# Altium footprint library SAMTEC THD.PcbLib: 161 footprints (part 11 of 12)
Each footprint in its own frame and in the unit in brackets; x right, y up, seen from the top. Pads: shape width x height; smd on the part's side, far side on the other; paste and mask are expansions set on the pad; w line width, h text height; cw(c..) or ccw(c..) is an arc to the next point about the centre after c.
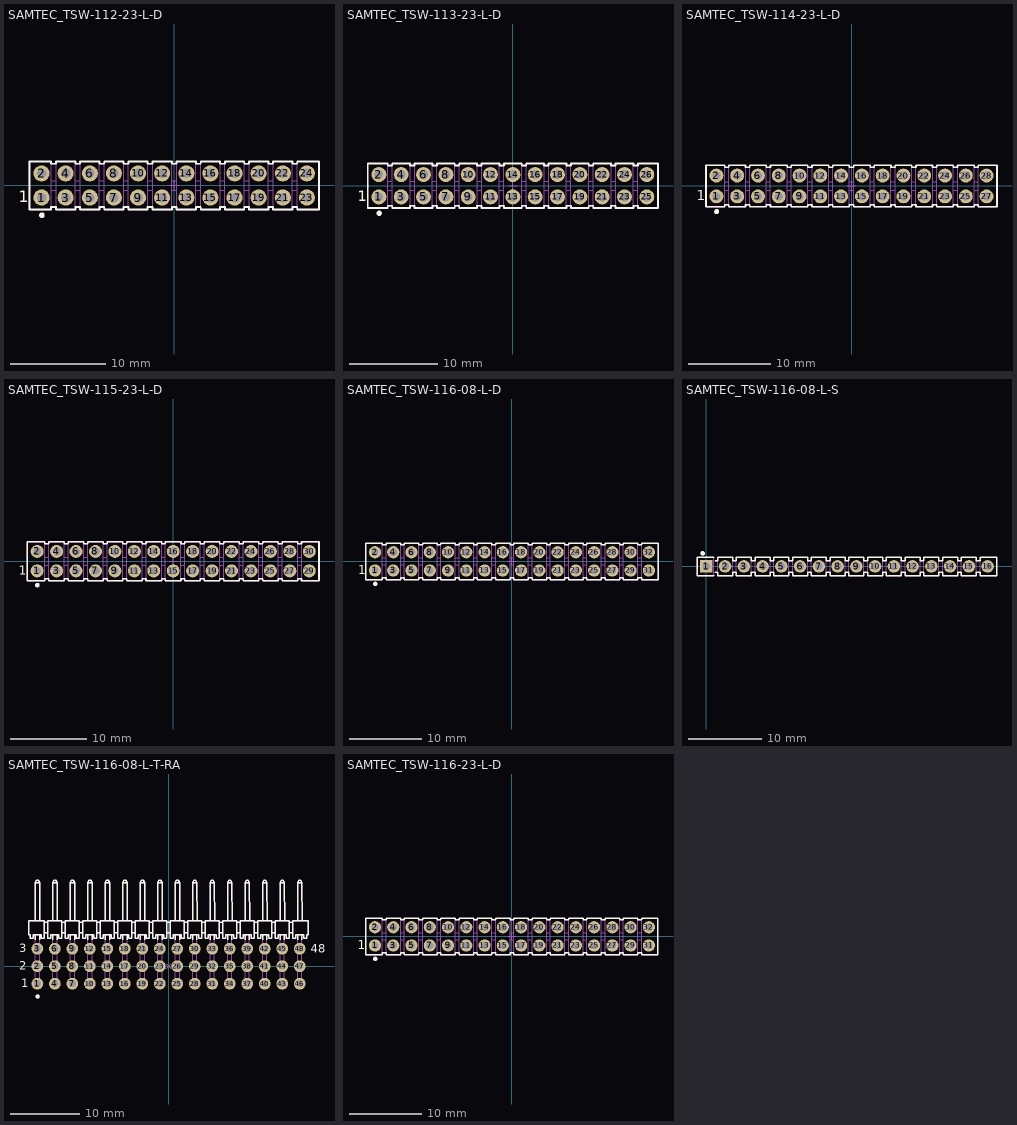
[diagram p10: the footprints below, top view; thin cyan lines are the x and y axes]

## SAMTEC_TSW-112-23-L-D [mm] "24 Contacts - Pitch 2.54mm - Dual Row  Through Mount Straigh Header (Post Lead 5.84mm, Tail Lead 2.92mm, Insulator 2.54mm)"
height 8.38
pads (24):
  round 1.7 hole 1: 1(-13.97,-1.27) 2(-13.97,1.27) 3(-11.43,-1.27) 4(-11.43,1.27) 5(-8.89,-1.27) 6(-8.89,1.27) 7(-6.35,-1.27) 8(-6.35,1.27) 9(-3.81,-1.27) 10(-3.81,1.27) 11(-1.27,-1.27) 12(-1.27,1.27) 13(1.27,-1.27) 14(1.27,1.27) 15(3.81,-1.27) 16(3.81,1.27) 17(6.35,-1.27) 18(6.35,1.27) 19(8.89,-1.27) 20(8.89,1.27) 21(11.43,-1.27) 22(11.43,1.27) 23(13.97,-1.27) 24(13.97,1.27)
Top Overlay:
  circle w0.3: c-13.935,-3.135 r0.15
  lines w0.2: -15.24,-2.54 -15.24,2.54 -12.954,2.54 -12.954,2.286 -12.446,2.286 -12.446,2.54 -10.414,2.54 -10.414,2.286 -9.906,2.286 -9.906,2.54 -7.874,2.54 -7.874,2.286 -7.366,2.286 -7.366,2.54 -5.334,2.54 -5.334,2.286 -4.826,2.286 -4.826,2.54 -2.794,2.54 -2.794,2.286 -2.286,2.286 -2.286,2.54 -0.254,2.54 -0.254,2.286 0.254,2.286 0.254,2.54 2.286,2.54 2.286,2.286 2.794,2.286 2.794,2.54 4.826,2.54 4.826,2.286 5.334,2.286 5.334,2.54 7.366,2.54 7.366,2.286 7.874,2.286 7.874,2.54 9.906,2.54 9.906,2.286 10.414,2.286 10.414,2.54 12.446,2.54 12.446,2.286 12.954,2.286 12.954,2.54 15.24,2.54 15.24,-2.54 12.954,-2.54 12.954,-2.286 12.446,-2.286 12.446,-2.54 10.414,-2.54 10.414,-2.286 9.906,-2.286 9.906,-2.54 7.874,-2.54 7.874,-2.286 7.366,-2.286 7.366,-2.54 5.334,-2.54 5.334,-2.286 4.826,-2.286 4.826,-2.54 2.794,-2.54 2.794,-2.286 2.286,-2.286 2.286,-2.54 0.254,-2.54 0.254,-2.286 -0.254,-2.286 -0.254,-2.54 -2.286,-2.54 -2.286,-2.286 -2.794,-2.286 -2.794,-2.54 -4.826,-2.54 -4.826,-2.286 -5.334,-2.286 -5.334,-2.54 -7.366,-2.54 -7.366,-2.286 -7.874,-2.286 -7.874,-2.54 -9.906,-2.54 -9.906,-2.286 -10.414,-2.286 -10.414,-2.54 -12.446,-2.54 -12.446,-2.286 -12.954,-2.286 -12.954,-2.54 -15.24,-2.54
  text "1" at -16.342,-1.768 h1.2
Mechanical 8:
  lines w0.05: -14.47,-1.27 -13.97,-1.27 ; -14.47,1.27 -13.97,1.27 ; -13.97,-1.77 -13.97,-1.27 ; -13.97,-0.77 -13.97,-1.27 ; -13.97,0.77 -13.97,1.27 ; -13.97,1.77 -13.97,1.27 ; -13.47,-1.27 -13.97,-1.27 ; -13.47,1.27 -13.97,1.27 ; -11.93,-1.27 -11.43,-1.27 ; -11.93,1.27 -11.43,1.27 ; -11.43,-1.77 -11.43,-1.27 ; -11.43,-0.77 -11.43,-1.27 ; -11.43,0.77 -11.43,1.27 ; -11.43,1.77 -11.43,1.27 ; -10.93,-1.27 -11.43,-1.27 ; -10.93,1.27 -11.43,1.27 ; -9.39,-1.27 -8.89,-1.27 ; -9.39,1.27 -8.89,1.27 ; -8.89,-1.77 -8.89,-1.27 ; -8.89,-0.77 -8.89,-1.27 ; -8.89,0.77 -8.89,1.27 ; -8.89,1.77 -8.89,1.27 ; -8.39,-1.27 -8.89,-1.27 ; -8.39,1.27 -8.89,1.27 ; -6.85,-1.27 -6.35,-1.27 ; -6.85,1.27 -6.35,1.27 ; -6.35,-1.77 -6.35,-1.27 ; -6.35,-0.77 -6.35,-1.27 ; -6.35,0.77 -6.35,1.27 ; -6.35,1.77 -6.35,1.27 ; -5.85,-1.27 -6.35,-1.27 ; -5.85,1.27 -6.35,1.27 ; -4.31,-1.27 -3.81,-1.27 ; -4.31,1.27 -3.81,1.27 ; -3.81,-1.77 -3.81,-1.27 ; -3.81,-0.77 -3.81,-1.27 ; -3.81,0.77 -3.81,1.27 ; -3.81,1.77 -3.81,1.27 ; -3.31,-1.27 -3.81,-1.27 ; -3.31,1.27 -3.81,1.27 ; -1.77,-1.27 -1.27,-1.27 ; -1.77,1.27 -1.27,1.27 ; -1.27,-1.77 -1.27,-1.27 ; -1.27,-0.77 -1.27,-1.27 ; -1.27,0.77 -1.27,1.27 ; -1.27,1.77 -1.27,1.27 ; -0.77,-1.27 -1.27,-1.27 ; -0.77,1.27 -1.27,1.27 ; -0.5,0 0,0 ; 0,-0.5 0,0 ; 0,0.5 0,0 ; 0.5,0 0,0 ; 0.77,-1.27 1.27,-1.27 ; 0.77,1.27 1.27,1.27 ; 1.27,-1.77 1.27,-1.27 ; 1.27,-0.77 1.27,-1.27 ; 1.27,0.77 1.27,1.27 ; 1.27,1.77 1.27,1.27 ; 1.77,-1.27 1.27,-1.27 ; 1.77,1.27 1.27,1.27 ; 3.31,-1.27 3.81,-1.27 ; 3.31,1.27 3.81,1.27 ; 3.81,-1.77 3.81,-1.27 ; 3.81,-0.77 3.81,-1.27 ; 3.81,0.77 3.81,1.27 ; 3.81,1.77 3.81,1.27 ; 4.31,-1.27 3.81,-1.27 ; 4.31,1.27 3.81,1.27 ; 5.85,-1.27 6.35,-1.27 ; 5.85,1.27 6.35,1.27 ; 6.35,-1.77 6.35,-1.27 ; 6.35,-0.77 6.35,-1.27 ; 6.35,0.77 6.35,1.27 ; 6.35,1.77 6.35,1.27 ; 6.85,-1.27 6.35,-1.27 ; 6.85,1.27 6.35,1.27 ; 8.39,-1.27 8.89,-1.27 ; 8.39,1.27 8.89,1.27 ; 8.89,-1.77 8.89,-1.27 ; 8.89,-0.77 8.89,-1.27 ; 8.89,0.77 8.89,1.27 ; 8.89,1.77 8.89,1.27 ; 9.39,-1.27 8.89,-1.27 ; 9.39,1.27 8.89,1.27 ; 10.93,-1.27 11.43,-1.27 ; 10.93,1.27 11.43,1.27 ; 11.43,-1.77 11.43,-1.27 ; 11.43,-0.77 11.43,-1.27 ; 11.43,0.77 11.43,1.27 ; 11.43,1.77 11.43,1.27 ; 11.93,-1.27 11.43,-1.27 ; 11.93,1.27 11.43,1.27 ; 13.47,-1.27 13.97,-1.27 ; 13.47,1.27 13.97,1.27 ; 13.97,-1.77 13.97,-1.27 ; 13.97,-0.77 13.97,-1.27 ; 13.97,0.77 13.97,1.27 ; 13.97,1.77 13.97,1.27 ; 14.47,-1.27 13.97,-1.27 ; 14.47,1.27 13.97,1.27
Mechanical 14:
  lines w0.1: -12.954,-2.286 -12.446,-2.286 ; -12.954,-0.508 -12.446,-0.508 ; -12.954,0.508 -12.446,0.508 ; -12.954,2.286 -12.446,2.286 ; -10.414,-2.286 -9.906,-2.286 ; -10.414,-0.508 -9.906,-0.508 ; -10.414,0.508 -9.906,0.508 ; -10.414,2.286 -9.906,2.286 ; -7.874,-2.286 -7.366,-2.286 ; -7.874,-0.508 -7.366,-0.508 ; -7.874,0.508 -7.366,0.508 ; -7.874,2.286 -7.366,2.286 ; -5.334,-2.286 -4.826,-2.286 ; -5.334,-0.508 -4.826,-0.508 ; -5.334,0.508 -4.826,0.508 ; -5.334,2.286 -4.826,2.286 ; -2.794,-2.286 -2.286,-2.286 ; -2.794,-0.508 -2.286,-0.508 ; -2.794,0.508 -2.286,0.508 ; -2.794,2.286 -2.286,2.286 ; -0.254,-2.286 0.254,-2.286 ; -0.254,-0.508 0.254,-0.508 ; -0.254,0.508 0.254,0.508 ; -0.254,2.286 0.254,2.286 ; 2.286,-2.286 2.794,-2.286 ; 2.286,-0.508 2.794,-0.508 ; 2.286,0.508 2.794,0.508 ; 2.286,2.286 2.794,2.286 ; 4.826,-2.286 5.334,-2.286 ; 4.826,-0.508 5.334,-0.508 ; 4.826,0.508 5.334,0.508 ; 4.826,2.286 5.334,2.286 ; 7.366,-2.286 7.874,-2.286 ; 7.366,-0.508 7.874,-0.508 ; 7.366,0.508 7.874,0.508 ; 7.366,2.286 7.874,2.286 ; 9.906,-2.286 10.414,-2.286 ; 9.906,-0.508 10.414,-0.508 ; 9.906,0.508 10.414,0.508 ; 9.906,2.286 10.414,2.286 ; 12.446,-2.286 12.954,-2.286 ; 12.446,-0.508 12.954,-0.508 ; 12.446,0.508 12.954,0.508 ; 12.446,2.286 12.954,2.286 ; -15.24,-2.54 -12.954,-2.54 -12.954,2.54 -15.24,2.54 -15.24,-2.54 ; -12.446,-2.54 -10.414,-2.54 -10.414,2.54 -12.446,2.54 -12.446,-2.54 ; -9.906,-2.54 -7.874,-2.54 -7.874,2.54 -9.906,2.54 -9.906,-2.54 ; -7.366,-2.54 -5.334,-2.54 -5.334,2.54 -7.366,2.54 -7.366,-2.54 ; -4.826,-2.54 -2.794,-2.54 -2.794,2.54 -4.826,2.54 -4.826,-2.54 ; -2.286,-2.54 -0.254,-2.54 -0.254,2.54 -2.286,2.54 -2.286,-2.54 ; 0.254,-2.54 2.286,-2.54 2.286,2.54 0.254,2.54 0.254,-2.54 ; 2.794,-2.54 4.826,-2.54 4.826,2.54 2.794,2.54 2.794,-2.54 ; 5.334,-2.54 7.366,-2.54 7.366,2.54 5.334,2.54 5.334,-2.54 ; 7.874,-2.54 9.906,-2.54 9.906,2.54 7.874,2.54 7.874,-2.54 ; 10.414,-2.54 12.446,-2.54 12.446,2.54 10.414,2.54 10.414,-2.54 ; 12.954,-2.54 15.24,-2.54 15.24,2.54 12.954,2.54 12.954,-2.54
3D body "SAMTEC_TSW-112-23-L-D.stp": height 8.38, standoff -2.92, extent -15.24,-2.54 15.24,2.54

## SAMTEC_TSW-113-23-L-D [mm] "26 Contacts - Pitch 2.54mm - Dual Row  Through Mount Straigh Header (Post Lead 5.84mm, Tail Lead 2.92mm, Insulator 2.54mm)"
height 8.38
pads (26):
  round 1.7 hole 1: 1(-15.24,-1.27) 2(-15.24,1.27) 3(-12.7,-1.27) 4(-12.7,1.27) 5(-10.16,-1.27) 6(-10.16,1.27) 7(-7.62,-1.27) 8(-7.62,1.27) 9(-5.08,-1.27) 10(-5.08,1.27) 11(-2.54,-1.27) 12(-2.54,1.27) 13(0,-1.27) 14(0,1.27) 15(2.54,-1.27) 16(2.54,1.27) 17(5.08,-1.27) 18(5.08,1.27) 19(7.62,-1.27) 20(7.62,1.27) 21(10.16,-1.27) 22(10.16,1.27) 23(12.7,-1.27) 24(12.7,1.27) 25(15.24,-1.27) 26(15.24,1.27)
Top Overlay:
  circle w0.3: c-15.205,-3.135 r0.15
  lines w0.2: -16.51,-2.54 -14.224,-2.54 -14.224,-2.286 -13.716,-2.286 -13.716,-2.54 -11.684,-2.54 -11.684,-2.286 -11.176,-2.286 -11.176,-2.54 -9.144,-2.54 -9.144,-2.286 -8.636,-2.286 -8.636,-2.54 -6.604,-2.54 -6.604,-2.286 -6.096,-2.286 -6.096,-2.54 -4.064,-2.54 -4.064,-2.286 -3.556,-2.286 -3.556,-2.54 -1.524,-2.54 -1.524,-2.286 -1.016,-2.286 -1.016,-2.54 1.016,-2.54 1.016,-2.286 1.524,-2.286 1.524,-2.54 3.556,-2.54 3.556,-2.286 4.064,-2.286 4.064,-2.54 6.096,-2.54 6.096,-2.286 6.604,-2.286 6.604,-2.54 8.636,-2.54 8.636,-2.286 9.144,-2.286 9.144,-2.54 11.176,-2.54 11.176,-2.286 11.684,-2.286 11.684,-2.54 13.716,-2.54 13.716,-2.286 14.224,-2.286 14.224,-2.54 16.51,-2.54 16.51,2.54 14.224,2.54 14.224,2.286 13.716,2.286 13.716,2.54 11.684,2.54 11.684,2.286 11.176,2.286 11.176,2.54 9.144,2.54 9.144,2.286 8.636,2.286 8.636,2.54 6.604,2.54 6.604,2.286 6.096,2.286 6.096,2.54 4.064,2.54 4.064,2.286 3.556,2.286 3.556,2.54 1.524,2.54 1.524,2.286 1.016,2.286 1.016,2.54 -1.016,2.54 -1.016,2.286 -1.524,2.286 -1.524,2.54 -3.556,2.54 -3.556,2.286 -4.064,2.286 -4.064,2.54 -6.096,2.54 -6.096,2.286 -6.604,2.286 -6.604,2.54 -8.636,2.54 -8.636,2.286 -9.144,2.286 -9.144,2.54 -11.176,2.54 -11.176,2.286 -11.684,2.286 -11.684,2.54 -13.716,2.54 -13.716,2.286 -14.224,2.286 -14.224,2.54 -16.51,2.54 -16.51,-2.54
  text "1" at -17.612,-1.768 h1.2
Mechanical 8:
  lines w0.05: -15.74,-1.27 -15.24,-1.27 ; -15.74,1.27 -15.24,1.27 ; -15.24,-1.77 -15.24,-1.27 ; -15.24,-0.77 -15.24,-1.27 ; -15.24,0.77 -15.24,1.27 ; -15.24,1.77 -15.24,1.27 ; -14.74,-1.27 -15.24,-1.27 ; -14.74,1.27 -15.24,1.27 ; -13.2,-1.27 -12.7,-1.27 ; -13.2,1.27 -12.7,1.27 ; -12.7,-1.77 -12.7,-1.27 ; -12.7,-0.77 -12.7,-1.27 ; -12.7,0.77 -12.7,1.27 ; -12.7,1.77 -12.7,1.27 ; -12.2,-1.27 -12.7,-1.27 ; -12.2,1.27 -12.7,1.27 ; -10.66,-1.27 -10.16,-1.27 ; -10.66,1.27 -10.16,1.27 ; -10.16,-1.77 -10.16,-1.27 ; -10.16,-0.77 -10.16,-1.27 ; -10.16,0.77 -10.16,1.27 ; -10.16,1.77 -10.16,1.27 ; -9.66,-1.27 -10.16,-1.27 ; -9.66,1.27 -10.16,1.27 ; -8.12,-1.27 -7.62,-1.27 ; -8.12,1.27 -7.62,1.27 ; -7.62,-1.77 -7.62,-1.27 ; -7.62,-0.77 -7.62,-1.27 ; -7.62,0.77 -7.62,1.27 ; -7.62,1.77 -7.62,1.27 ; -7.12,-1.27 -7.62,-1.27 ; -7.12,1.27 -7.62,1.27 ; -5.58,-1.27 -5.08,-1.27 ; -5.58,1.27 -5.08,1.27 ; -5.08,-1.77 -5.08,-1.27 ; -5.08,-0.77 -5.08,-1.27 ; -5.08,0.77 -5.08,1.27 ; -5.08,1.77 -5.08,1.27 ; -4.58,-1.27 -5.08,-1.27 ; -4.58,1.27 -5.08,1.27 ; -3.04,-1.27 -2.54,-1.27 ; -3.04,1.27 -2.54,1.27 ; -2.54,-1.77 -2.54,-1.27 ; -2.54,-0.77 -2.54,-1.27 ; -2.54,0.77 -2.54,1.27 ; -2.54,1.77 -2.54,1.27 ; -2.04,-1.27 -2.54,-1.27 ; -2.04,1.27 -2.54,1.27 ; -0.5,-1.27 0,-1.27 ; -0.5,0 0,0 ; -0.5,1.27 0,1.27 ; 0,-1.77 0,-1.27 ; 0,-0.77 0,-1.27 ; 0,-0.5 0,0 ; 0,0.5 0,0 ; 0,0.77 0,1.27 ; 0,1.77 0,1.27 ; 0.5,-1.27 0,-1.27 ; 0.5,0 0,0 ; 0.5,1.27 0,1.27 ; 2.04,-1.27 2.54,-1.27 ; 2.04,1.27 2.54,1.27 ; 2.54,-1.77 2.54,-1.27 ; 2.54,-0.77 2.54,-1.27 ; 2.54,0.77 2.54,1.27 ; 2.54,1.77 2.54,1.27 ; 3.04,-1.27 2.54,-1.27 ; 3.04,1.27 2.54,1.27 ; 4.58,-1.27 5.08,-1.27 ; 4.58,1.27 5.08,1.27 ; 5.08,-1.77 5.08,-1.27 ; 5.08,-0.77 5.08,-1.27 ; 5.08,0.77 5.08,1.27 ; 5.08,1.77 5.08,1.27 ; 5.58,-1.27 5.08,-1.27 ; 5.58,1.27 5.08,1.27 ; 7.12,-1.27 7.62,-1.27 ; 7.12,1.27 7.62,1.27 ; 7.62,-1.77 7.62,-1.27 ; 7.62,-0.77 7.62,-1.27 ; 7.62,0.77 7.62,1.27 ; 7.62,1.77 7.62,1.27 ; 8.12,-1.27 7.62,-1.27 ; 8.12,1.27 7.62,1.27 ; 9.66,-1.27 10.16,-1.27 ; 9.66,1.27 10.16,1.27 ; 10.16,-1.77 10.16,-1.27 ; 10.16,-0.77 10.16,-1.27 ; 10.16,0.77 10.16,1.27 ; 10.16,1.77 10.16,1.27 ; 10.66,-1.27 10.16,-1.27 ; 10.66,1.27 10.16,1.27 ; 12.2,-1.27 12.7,-1.27 ; 12.2,1.27 12.7,1.27 ; 12.7,-1.77 12.7,-1.27 ; 12.7,-0.77 12.7,-1.27 ; 12.7,0.77 12.7,1.27 ; 12.7,1.77 12.7,1.27 ; 13.2,-1.27 12.7,-1.27 ; 13.2,1.27 12.7,1.27 ; 14.74,-1.27 15.24,-1.27 ; 14.74,1.27 15.24,1.27 ; 15.24,-1.77 15.24,-1.27 ; 15.24,-0.77 15.24,-1.27 ; 15.24,0.77 15.24,1.27 ; 15.24,1.77 15.24,1.27 ; 15.74,-1.27 15.24,-1.27 ; 15.74,1.27 15.24,1.27
Mechanical 14:
  lines w0.1: -14.224,-2.286 -13.716,-2.286 ; -14.224,-0.508 -13.716,-0.508 ; -14.224,0.508 -13.716,0.508 ; -14.224,2.286 -13.716,2.286 ; -11.684,-2.286 -11.176,-2.286 ; -11.684,-0.508 -11.176,-0.508 ; -11.684,0.508 -11.176,0.508 ; -11.684,2.286 -11.176,2.286 ; -9.144,-2.286 -8.636,-2.286 ; -9.144,-0.508 -8.636,-0.508 ; -9.144,0.508 -8.636,0.508 ; -9.144,2.286 -8.636,2.286 ; -6.604,-2.286 -6.096,-2.286 ; -6.604,-0.508 -6.096,-0.508 ; -6.604,0.508 -6.096,0.508 ; -6.604,2.286 -6.096,2.286 ; -4.064,-2.286 -3.556,-2.286 ; -4.064,-0.508 -3.556,-0.508 ; -4.064,0.508 -3.556,0.508 ; -4.064,2.286 -3.556,2.286 ; -1.524,-2.286 -1.016,-2.286 ; -1.524,-0.508 -1.016,-0.508 ; -1.524,0.508 -1.016,0.508 ; -1.524,2.286 -1.016,2.286 ; 1.016,-2.286 1.524,-2.286 ; 1.016,-0.508 1.524,-0.508 ; 1.016,0.508 1.524,0.508 ; 1.016,2.286 1.524,2.286 ; 3.556,-2.286 4.064,-2.286 ; 3.556,-0.508 4.064,-0.508 ; 3.556,0.508 4.064,0.508 ; 3.556,2.286 4.064,2.286 ; 6.096,-2.286 6.604,-2.286 ; 6.096,-0.508 6.604,-0.508 ; 6.096,0.508 6.604,0.508 ; 6.096,2.286 6.604,2.286 ; 8.636,-2.286 9.144,-2.286 ; 8.636,-0.508 9.144,-0.508 ; 8.636,0.508 9.144,0.508 ; 8.636,2.286 9.144,2.286 ; 11.176,-2.286 11.684,-2.286 ; 11.176,-0.508 11.684,-0.508 ; 11.176,0.508 11.684,0.508 ; 11.176,2.286 11.684,2.286 ; 13.716,-2.286 14.224,-2.286 ; 13.716,-0.508 14.224,-0.508 ; 13.716,0.508 14.224,0.508 ; 13.716,2.286 14.224,2.286 ; -16.51,-2.54 -16.51,2.54 -14.224,2.54 -14.224,-2.54 -16.51,-2.54 ; -13.716,-2.54 -13.716,2.54 -11.684,2.54 -11.684,-2.54 -13.716,-2.54 ; -11.176,-2.54 -9.144,-2.54 -9.144,2.54 -11.176,2.54 -11.176,-2.54 ; -8.636,-2.54 -8.636,2.54 -6.604,2.54 -6.604,-2.54 -8.636,-2.54 ; -6.096,-2.54 -6.096,2.54 -4.064,2.54 -4.064,-2.54 -6.096,-2.54 ; -3.556,-2.54 -3.556,2.54 -1.524,2.54 -1.524,-2.54 -3.556,-2.54 ; -1.016,-2.54 -1.016,2.54 1.016,2.54 1.016,-2.54 -1.016,-2.54 ; 1.524,-2.54 1.524,2.54 3.556,2.54 3.556,-2.54 1.524,-2.54 ; 4.064,-2.54 4.064,2.54 6.096,2.54 6.096,-2.54 4.064,-2.54 ; 6.604,-2.54 6.604,2.54 8.636,2.54 8.636,-2.54 6.604,-2.54 ; 9.144,-2.54 9.144,2.54 11.176,2.54 11.176,-2.54 9.144,-2.54 ; 11.684,-2.54 11.684,2.54 13.716,2.54 13.716,-2.54 11.684,-2.54 ; 14.224,-2.54 14.224,2.54 16.51,2.54 16.51,-2.54 14.224,-2.54
3D body "SAMTEC_TSW-113-23-L-D.stp": height 8.38, standoff -2.92, extent -16.51,-2.54 16.51,2.54

## SAMTEC_TSW-114-23-L-D [mm] "28 Contacts - Pitch 2.54mm - Dual Row  Through Mount Straigh Header (Post Lead 5.84mm, Tail Lead 2.92mm, Insulator 2.54mm)"
height 8.38
pads (28):
  round 1.7 hole 1: 1(-16.51,-1.27) 2(-16.51,1.27) 3(-13.97,-1.27) 4(-13.97,1.27) 5(-11.43,-1.27) 6(-11.43,1.27) 7(-8.89,-1.27) 8(-8.89,1.27) 9(-6.35,-1.27) 10(-6.35,1.27) 11(-3.81,-1.27) 12(-3.81,1.27) 13(-1.27,-1.27) 14(-1.27,1.27) 15(1.27,-1.27) 16(1.27,1.27) 17(3.81,-1.27) 18(3.81,1.27) 19(6.35,-1.27) 20(6.35,1.27) 21(8.89,-1.27) 22(8.89,1.27) 23(11.43,-1.27) 24(11.43,1.27) 25(13.97,-1.27) 26(13.97,1.27) 27(16.51,-1.27) 28(16.51,1.27)
Top Overlay:
  circle w0.3: c-16.475,-3.135 r0.15
  lines w0.2: -17.78,-2.54 -15.494,-2.54 -15.494,-2.286 -14.986,-2.286 -14.986,-2.54 -12.954,-2.54 -12.954,-2.286 -12.446,-2.286 -12.446,-2.54 -10.414,-2.54 -10.414,-2.286 -9.906,-2.286 -9.906,-2.54 -7.874,-2.54 -7.874,-2.286 -7.366,-2.286 -7.366,-2.54 -5.334,-2.54 -5.334,-2.286 -4.826,-2.286 -4.826,-2.54 -2.794,-2.54 -2.794,-2.286 -2.286,-2.286 -2.286,-2.54 -0.254,-2.54 -0.254,-2.286 0.254,-2.286 0.254,-2.54 2.286,-2.54 2.286,-2.286 2.794,-2.286 2.794,-2.54 4.826,-2.54 4.826,-2.286 5.334,-2.286 5.334,-2.54 7.366,-2.54 7.366,-2.286 7.874,-2.286 7.874,-2.54 9.906,-2.54 9.906,-2.286 10.414,-2.286 10.414,-2.54 12.446,-2.54 12.446,-2.286 12.954,-2.286 12.954,-2.54 14.986,-2.54 14.986,-2.286 15.494,-2.286 15.494,-2.54 17.78,-2.54 17.78,2.54 15.494,2.54 15.494,2.286 14.986,2.286 14.986,2.54 12.954,2.54 12.954,2.286 12.446,2.286 12.446,2.54 10.414,2.54 10.414,2.286 9.906,2.286 9.906,2.54 7.874,2.54 7.874,2.286 7.366,2.286 7.366,2.54 5.334,2.54 5.334,2.286 4.826,2.286 4.826,2.54 2.794,2.54 2.794,2.286 2.286,2.286 2.286,2.54 0.254,2.54 0.254,2.286 -0.254,2.286 -0.254,2.54 -2.286,2.54 -2.286,2.286 -2.794,2.286 -2.794,2.54 -4.826,2.54 -4.826,2.286 -5.334,2.286 -5.334,2.54 -7.366,2.54 -7.366,2.286 -7.874,2.286 -7.874,2.54 -9.906,2.54 -9.906,2.286 -10.414,2.286 -10.414,2.54 -12.446,2.54 -12.446,2.286 -12.954,2.286 -12.954,2.54 -14.986,2.54 -14.986,2.286 -15.494,2.286 -15.494,2.54 -17.78,2.54 -17.78,-2.54
  text "1" at -18.882,-1.768 h1.2
Mechanical 8:
  lines w0.05: -17.01,-1.27 -16.51,-1.27 ; -17.01,1.27 -16.51,1.27 ; -16.51,-1.77 -16.51,-1.27 ; -16.51,-0.77 -16.51,-1.27 ; -16.51,0.77 -16.51,1.27 ; -16.51,1.77 -16.51,1.27 ; -16.01,-1.27 -16.51,-1.27 ; -16.01,1.27 -16.51,1.27 ; -14.47,-1.27 -13.97,-1.27 ; -14.47,1.27 -13.97,1.27 ; -13.97,-1.77 -13.97,-1.27 ; -13.97,-0.77 -13.97,-1.27 ; -13.97,0.77 -13.97,1.27 ; -13.97,1.77 -13.97,1.27 ; -13.47,-1.27 -13.97,-1.27 ; -13.47,1.27 -13.97,1.27 ; -11.93,-1.27 -11.43,-1.27 ; -11.93,1.27 -11.43,1.27 ; -11.43,-1.77 -11.43,-1.27 ; -11.43,-0.77 -11.43,-1.27 ; -11.43,0.77 -11.43,1.27 ; -11.43,1.77 -11.43,1.27 ; -10.93,-1.27 -11.43,-1.27 ; -10.93,1.27 -11.43,1.27 ; -9.39,-1.27 -8.89,-1.27 ; -9.39,1.27 -8.89,1.27 ; -8.89,-1.77 -8.89,-1.27 ; -8.89,-0.77 -8.89,-1.27 ; -8.89,0.77 -8.89,1.27 ; -8.89,1.77 -8.89,1.27 ; -8.39,-1.27 -8.89,-1.27 ; -8.39,1.27 -8.89,1.27 ; -6.85,-1.27 -6.35,-1.27 ; -6.85,1.27 -6.35,1.27 ; -6.35,-1.77 -6.35,-1.27 ; -6.35,-0.77 -6.35,-1.27 ; -6.35,0.77 -6.35,1.27 ; -6.35,1.77 -6.35,1.27 ; -5.85,-1.27 -6.35,-1.27 ; -5.85,1.27 -6.35,1.27 ; -4.31,-1.27 -3.81,-1.27 ; -4.31,1.27 -3.81,1.27 ; -3.81,-1.77 -3.81,-1.27 ; -3.81,-0.77 -3.81,-1.27 ; -3.81,0.77 -3.81,1.27 ; -3.81,1.77 -3.81,1.27 ; -3.31,-1.27 -3.81,-1.27 ; -3.31,1.27 -3.81,1.27 ; -1.77,-1.27 -1.27,-1.27 ; -1.77,1.27 -1.27,1.27 ; -1.27,-1.77 -1.27,-1.27 ; -1.27,-0.77 -1.27,-1.27 ; -1.27,0.77 -1.27,1.27 ; -1.27,1.77 -1.27,1.27 ; -0.77,-1.27 -1.27,-1.27 ; -0.77,1.27 -1.27,1.27 ; -0.5,0 0,0 ; 0,-0.5 0,0 ; 0,0.5 0,0 ; 0.5,0 0,0 ; 0.77,-1.27 1.27,-1.27 ; 0.77,1.27 1.27,1.27 ; 1.27,-1.77 1.27,-1.27 ; 1.27,-0.77 1.27,-1.27 ; 1.27,0.77 1.27,1.27 ; 1.27,1.77 1.27,1.27 ; 1.77,-1.27 1.27,-1.27 ; 1.77,1.27 1.27,1.27 ; 3.31,-1.27 3.81,-1.27 ; 3.31,1.27 3.81,1.27 ; 3.81,-1.77 3.81,-1.27 ; 3.81,-0.77 3.81,-1.27 ; 3.81,0.77 3.81,1.27 ; 3.81,1.77 3.81,1.27 ; 4.31,-1.27 3.81,-1.27 ; 4.31,1.27 3.81,1.27 ; 5.85,-1.27 6.35,-1.27 ; 5.85,1.27 6.35,1.27 ; 6.35,-1.77 6.35,-1.27 ; 6.35,-0.77 6.35,-1.27 ; 6.35,0.77 6.35,1.27 ; 6.35,1.77 6.35,1.27 ; 6.85,-1.27 6.35,-1.27 ; 6.85,1.27 6.35,1.27 ; 8.39,-1.27 8.89,-1.27 ; 8.39,1.27 8.89,1.27 ; 8.89,-1.77 8.89,-1.27 ; 8.89,-0.77 8.89,-1.27 ; 8.89,0.77 8.89,1.27 ; 8.89,1.77 8.89,1.27 ; 9.39,-1.27 8.89,-1.27 ; 9.39,1.27 8.89,1.27 ; 10.93,-1.27 11.43,-1.27 ; 10.93,1.27 11.43,1.27 ; 11.43,-1.77 11.43,-1.27 ; 11.43,-0.77 11.43,-1.27 ; 11.43,0.77 11.43,1.27 ; 11.43,1.77 11.43,1.27 ; 11.93,-1.27 11.43,-1.27 ; 11.93,1.27 11.43,1.27 ; 13.47,-1.27 13.97,-1.27 ; 13.47,1.27 13.97,1.27 ; 13.97,-1.77 13.97,-1.27 ; 13.97,-0.77 13.97,-1.27 ; 13.97,0.77 13.97,1.27 ; 13.97,1.77 13.97,1.27 ; 14.47,-1.27 13.97,-1.27 ; 14.47,1.27 13.97,1.27 ; 16.01,-1.27 16.51,-1.27 ; 16.01,1.27 16.51,1.27 ; 16.51,-1.77 16.51,-1.27 ; 16.51,-0.77 16.51,-1.27 ; 16.51,0.77 16.51,1.27 ; 16.51,1.77 16.51,1.27 ; 17.01,-1.27 16.51,-1.27 ; 17.01,1.27 16.51,1.27
Mechanical 14:
  lines w0.1: -15.494,-2.286 -14.986,-2.286 ; -15.494,-0.508 -14.986,-0.508 ; -15.494,0.508 -14.986,0.508 ; -15.494,2.286 -14.986,2.286 ; -12.954,-2.286 -12.446,-2.286 ; -12.954,-0.508 -12.446,-0.508 ; -12.954,0.508 -12.446,0.508 ; -12.954,2.286 -12.446,2.286 ; -12.446,-2.54 -12.446,2.54 -10.414,2.54 -10.414,-2.54 ; -10.414,-2.286 -9.906,-2.286 ; -10.414,-0.508 -9.906,-0.508 ; -10.414,0.508 -9.906,0.508 ; -10.414,2.286 -9.906,2.286 ; -7.874,-2.286 -7.366,-2.286 ; -7.874,-0.508 -7.366,-0.508 ; -7.874,0.508 -7.366,0.508 ; -7.874,2.286 -7.366,2.286 ; -5.334,-2.286 -4.826,-2.286 ; -5.334,-0.508 -4.826,-0.508 ; -5.334,0.508 -4.826,0.508 ; -5.334,2.286 -4.826,2.286 ; -2.794,-2.286 -2.286,-2.286 ; -2.794,-0.508 -2.286,-0.508 ; -2.794,0.508 -2.286,0.508 ; -2.794,2.286 -2.286,2.286 ; -0.254,-2.286 0.254,-2.286 ; -0.254,-0.508 0.254,-0.508 ; -0.254,0.508 0.254,0.508 ; -0.254,2.286 0.254,2.286 ; 2.286,-2.286 2.794,-2.286 ; 2.286,-0.508 2.794,-0.508 ; 2.286,0.508 2.794,0.508 ; 2.286,2.286 2.794,2.286 ; 4.826,-2.286 5.334,-2.286 ; 4.826,-0.508 5.334,-0.508 ; 4.826,0.508 5.334,0.508 ; 4.826,2.286 5.334,2.286 ; 7.366,-2.286 7.874,-2.286 ; 7.366,-0.508 7.874,-0.508 ; 7.366,0.508 7.874,0.508 ; 7.366,2.286 7.874,2.286 ; 9.906,-2.286 10.414,-2.286 ; 9.906,-0.508 10.414,-0.508 ; 9.906,0.508 10.414,0.508 ; 9.906,2.286 10.414,2.286 ; 12.446,-2.286 12.954,-2.286 ; 12.446,-0.508 12.954,-0.508 ; 12.446,0.508 12.954,0.508 ; 12.446,2.286 12.954,2.286 ; 14.986,-2.286 15.494,-2.286 ; 14.986,-0.508 15.494,-0.508 ; 14.986,0.508 15.494,0.508 ; 14.986,2.286 15.494,2.286 ; -17.78,-2.54 -17.78,2.54 -15.494,2.54 -15.494,-2.54 -17.78,-2.54 ; -14.986,-2.54 -14.986,2.54 -12.954,2.54 -12.954,-2.54 -14.986,-2.54 ; -9.906,-2.54 -9.906,2.54 -7.874,2.54 -7.874,-2.54 -9.906,-2.54 ; -7.366,-2.54 -7.366,2.54 -5.334,2.54 -5.334,-2.54 -7.366,-2.54 ; -4.826,-2.54 -4.826,2.54 -2.794,2.54 -2.794,-2.54 -4.826,-2.54 ; -2.286,-2.54 -2.286,2.54 -0.254,2.54 -0.254,-2.54 -2.286,-2.54 ; 0.254,-2.54 0.254,2.54 2.286,2.54 2.286,-2.54 0.254,-2.54 ; 2.794,-2.54 2.794,2.54 4.826,2.54 4.826,-2.54 2.794,-2.54 ; 5.334,-2.54 5.334,2.54 7.366,2.54 7.366,-2.54 5.334,-2.54 ; 7.874,-2.54 7.874,2.54 9.906,2.54 9.906,-2.54 7.874,-2.54 ; 10.414,-2.54 10.414,2.54 12.446,2.54 12.446,-2.54 10.414,-2.54 ; 12.954,-2.54 12.954,2.54 14.986,2.54 14.986,-2.54 12.954,-2.54 ; 15.494,-2.54 15.494,2.54 17.78,2.54 17.78,-2.54 15.494,-2.54
3D body "SAMTEC_TSW-114-23-L-D.stp": height 8.38, standoff -2.92, extent -17.78,-2.54 17.78,2.54
